# Altium footprint library 3.Inductors&Transformers.PcbLib: 51 footprints (part 2 of 4)
Each footprint in its own frame and in the unit in brackets; x right, y up, seen from the top. Pads: shape width x height; smd on the part's side, far side on the other; paste and mask are expansions set on the pad; w line width, h text height; cw(c..) or ccw(c..) is an arc to the next point about the centre after c.
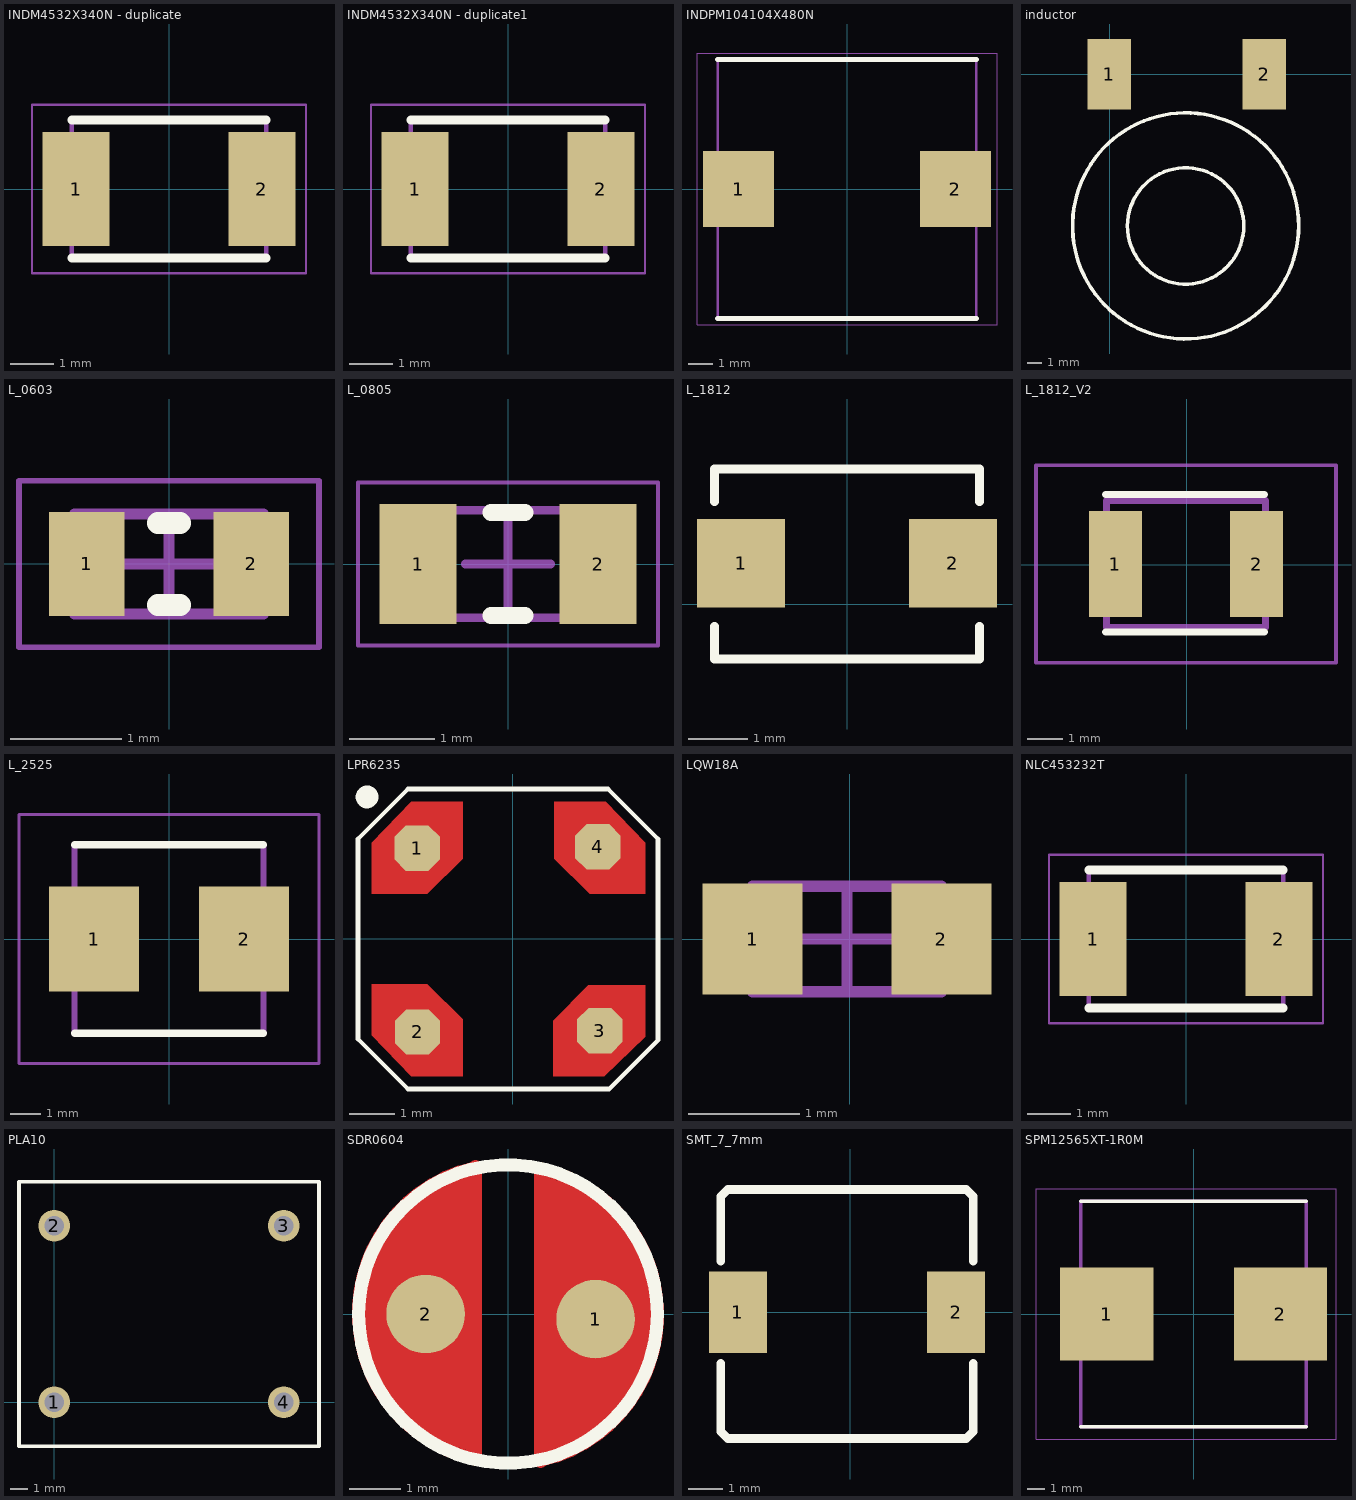
[diagram p1: the footprints below, top view; thin cyan lines are the x and y axes]

## INDM4532X340N - duplicate [mm]
pads (2):
  rect 1.55x2.65 smd: 1(-2.15,0) 2(2.15,0)
Top Overlay:
  lines w0.2: -2.25,-1.6 2.25,-1.6 ; -2.25,1.6 2.25,1.6
Mechanical 13:
  lines w0.1: -2.25,-1.6 2.25,-1.6 2.25,1.6 -2.25,1.6 -2.25,-1.6
Mechanical 15:
  lines w0.05: -3.175,-1.95 3.175,-1.95 3.175,1.95 -3.175,1.95 -3.175,-1.95
3D body "NLC453232T-101K-PF.stp": height 3.4, standoff 0, extent -2.25,-1.6 2.25,1.6

## INDM4532X340N - duplicate1 [mm]
pads (2):
  rect 1.55x2.65 smd: 1(-2.15,0) 2(2.15,0)
Top Overlay:
  lines w0.2: -2.25,-1.6 2.25,-1.6 ; -2.25,1.6 2.25,1.6
Mechanical 13:
  lines w0.1: -2.25,-1.6 -2.25,1.6 2.25,1.6 2.25,-1.6 -2.25,-1.6
Mechanical 15:
  lines w0.05: -3.175,-1.95 -3.175,1.95 3.175,1.95 3.175,-1.95 -3.175,-1.95
3D body "NLC453232T-101K-PF.stp": height 3.4, standoff 0, extent -2.25,-1.6 2.25,1.6

## INDPM104104X480N [mm]
pads (2):
  rect 2.85x3.05 smd: 1(-4.35,0) 2(4.35,0)
Top Overlay:
  lines w0.2: -5.2,-5.2 5.2,-5.2 ; -5.2,5.2 5.2,5.2
Mechanical 13:
  lines w0.1: -5.2,-5.2 5.2,-5.2 5.2,5.2 -5.2,5.2 -5.2,-5.2
Mechanical 15:
  lines w0.05: -6.025,-5.45 6.025,-5.45 6.025,5.45 -6.025,5.45 -6.025,-5.45
3D body "B82464G4153M.stp": height 4.65, standoff -0.05, extent -5,-5 5,5

## inductor [mm]
pads (2):
  rect 3.1x5 smd: 1(-0.025,0) 2(11,0)
Top Overlay:
  circle w0.254: c5.4,-10.8 r4.14
  circle w0.254: c5.4,-10.8 r8.045

## L_0603 [mm] "Chip Inductor, 2-Leads, Body 1,60x0,80mm, IPC Medium Density"
height 0.45
pads (2):
  rect 0.68x0.94 smd: 1(-0.74,0) 2(0.74,0)
Top Overlay:
  lines w0.2: -0.1,-0.37 0.1,-0.37 ; -0.1,0.37 0.1,0.37
Mechanical 13:
  lines w0.1: -0.85,-0.45 0.85,-0.45 0.85,0.45 -0.85,0.45 -0.85,-0.45
Mechanical 15:
  lines w0.05: -1.35,-0.75 1.35,-0.75 1.35,0.75 -1.35,0.75 -1.35,-0.75
  lines w0.1: -0.45,0 0.45,0 ; 0,-0.45 0,0.45
3D body "User Library-Chip Inductor.step": height 0.8, standoff 0, extent -0.851,-0.457 0.749,0.493

## L_0805 [mm] "Chip Capacitor, 2-Leads, Body 2,00x1,25mm, IPC Medium Density"
height 1.3
pads (2):
  rect 0.9x1.4 smd: 1(-1.05,0) 2(1.05,0)
Top Overlay:
  lines w0.2: -0.2,-0.6 0.2,-0.6 ; -0.2,0.6 0.2,0.6
Mechanical 13:
  lines w0.1: -1,-0.625 1,-0.625 1,0.625 -1,0.625 -1,-0.625
Mechanical 15:
  lines w0.05: -1.75,-0.95 1.75,-0.95 1.75,0.95 -1.75,0.95 -1.75,-0.95
  lines w0.1: -0.5,0 0.5,0 ; 0,-0.5 0,0.5
3D body "Coilcraft-0805CS.step": height 1.51, standoff -0.01, extent -1.144,-0.862 1.145,0.863

## L_1812 [mm]
pads (2):
  rect 1.5x1.5 smd: 1(-1.8,0.7) 2(1.8,0.7)
Top Overlay:
  lines w0.15: -2.25,-0.375 -2.25,-0.925 2.25,-0.925 2.25,-0.375 ; -2.25,1.75 -2.25,2.3 2.25,2.3 2.25,1.75
3D body "User Library-L_SMD.step": height 3.2, standoff 0, extent -2.25,-0.875 2.25,2.325

## L_1812_V2 [mm]
pads (2):
  rect 1.5x3 smd: 1(-2.025,0.025) 2(1.975,0.025)
Top Overlay:
  lines w0.2: -2.3,-1.9 2.2,-1.9 ; -2.3,2 2.2,2
Mechanical 13:
  lines w0.2: -2.275,-1.775 2.225,-1.775 2.225,1.825 -2.275,1.825 -2.275,-1.775
Mechanical 15:
  lines w0.1: -4.275,-2.775 4.225,-2.775 4.225,2.825 -4.275,2.825 -4.275,-2.775
3D body "LQH43MN471K03K.stp": height 2.8, standoff 0, extent -2.275,-1.875 2.225,1.925

## L_2525 [mm]
pads (2):
  rect 3x3.5 smd: 1(-2.5,0) 2(2.5,0)
Top Overlay:
  lines w0.25: -3.15,-3.15 3.15,-3.15 ; -3.15,3.15 3.15,3.15
Mechanical 13:
  lines w0.2: -3.15,-3.15 -3.15,3.15 3.15,3.15 3.15,-3.15 -3.15,-3.15
Mechanical 15:
  lines w0.1: -5,-4.15 -5,4.15 5,4.15 5,-4.15 -5,-4.15
3D body "LQH66SN471M03K.stp": height 4.7, standoff 0, extent -3.15,-3.15 3.15,3.15

## LPR6235 [mm]
pads (4):
  oct 1x1 smd: 1(-2.1,2) 2(-2.091,-2.046) 3(1.921,-2.016) 4(1.875,2.025)
Top Layer:
  region: -3.1,2.121 -2.225,3.021 -1.1,3.021 -1.1,1.771 -1.875,0.996 -3.1,0.996
  region: -3.1,-2.121 -2.225,-3.021 -1.1,-3.021 -1.1,-1.771 -1.875,-0.996 -3.1,-0.996
  region: 2.021,-3.021 2.921,-2.146 2.921,-1.021 1.671,-1.021 0.896,-1.796 0.896,-3.021
  region: 2.921,2.121 2.046,3.021 0.921,3.021 0.921,1.771 1.696,0.996 2.921,0.996
Top Overlay:
  circle w0.3: c-3.2,3.125 r0.1
  lines w0.1: -3.4,-2.2 -2.3,-3.3 2.125,-3.3 3.2,-2.225 3.2,2.2 2.1,3.3 -2.3,3.3 -3.4,2.2 -3.4,-2.2
3D body "Coilcraft-LPR6235.step": height 3.35, standoff -0.15, extent -3.173,-3.012 2.907,3.068

## LQW18A [mm]
pads (2):
  rect 0.9x1 smd: 1(-0.875,0) 2(0.825,0)
Mechanical 13:
  lines w0.1: -0.875,-0.475 -0.875,0.475 0.825,0.475 0.825,-0.475 -0.875,-0.475
Mechanical 15:
  lines w0.1: -0.5,0 0.45,0 ; -0.025,-0.475 -0.025,0.475
3D body "User Library-INDC1608X80-MURATA_LQW18A.step": height 0.81, standoff 0, extent -0.8,-0.45 0.8,0.45

## NLC453232T [mm]
pads (2):
  rect 1.55x2.65 smd: 1(-2.15,0) 2(2.15,0)
Top Overlay:
  lines w0.2: -2.25,-1.6 2.25,-1.6 ; -2.25,1.6 2.25,1.6
Mechanical 13:
  lines w0.1: -2.25,-1.6 2.25,-1.6 2.25,1.6 -2.25,1.6 -2.25,-1.6
Mechanical 15:
  lines w0.05: -3.175,-1.95 3.175,-1.95 3.175,1.95 -3.175,1.95 -3.175,-1.95
3D body "NLC453232T-101K-PF.stp": height 3.4, standoff 0, extent -2.25,-1.6 2.25,1.6

## PLA10 [mm]
pads (4):
  round 1.8 hole 1.1: 1(0,0) 2(0,10) 3(13,10) 4(13,0)
Top Overlay:
  lines w0.2: -2,-2.5 15,-2.5 15,12.5 -2,12.5 -2,-2.5
3D body "User Library-PLA10.STEP": height 16.3, standoff -3.3, extent -1.921,-2.475 14.871,12.525

## SDR0604 [mil]
pads (2):
  round 60 smd: 1(66.93,-3.94) 2(-62.99,0)
Top Layer:
  region: -24.9,-106.3 -26.57,-104.63 -26.57,111.6 -34.07,111.6 -47.24,98.43 -59.06,98.43 -82.68,74.8 -86.61,74.8 -86.61,66.93 -110.24,35.43 -114.17,-19.69 -106.3,-43.31 -94.49,-66.93 -59.06,-102.36 -51.18,-102.36 -47.24,-98.43
  region: 24.9,106.3 26.57,104.63 26.57,-111.6 34.07,-111.6 47.24,-98.43 59.06,-98.43 82.68,-74.8 86.61,-74.8 86.61,-66.93 110.24,-35.43 114.17,19.69 106.3,43.31 94.49,66.93 59.06,102.36 51.18,102.36 47.24,98.43
  lines w10: -26.57,111.6 ccw(c-0.13,0.53) -24.9,-110.93 -24.9,112.9 ; 24.9,-112.9 24.9,110.93 cw(c0.13,-0.53) 26.57,-111.6
Top Overlay:
  circle w10: c0,0 r114.17
3D body "SDR0604.step": height -15.75, standoff -194.88, extent -108.43,-106.3 108.43,114.17

## SMT_7_7mm [mm]
pads (2):
  rect 1.7x2.4 smd: 1(-3.3,0) 2(3.1,0)
Top Overlay:
  lines w0.254: -3.8,-1.5 -3.8,-3.5 -3.6,-3.7 3.4,-3.7 3.6,-3.5 3.6,-1.5 ; -3.8,1.5 -3.8,3.4 -3.6,3.6 3.4,3.6 3.6,3.4 3.6,1.5
3D body: height 4.5, standoff 0.1, extent -3.75,-3.7 3.55,3.6

## SPM12565XT-1R0M [mm]
pads (2):
  rect 5.2x5.2 smd: 1(-4.85,0) 2(4.85,0)
Top Overlay:
  lines w0.2: -6.3,-6.3 6.3,-6.3 ; -6.3,6.3 6.3,6.3
Mechanical 13:
  lines w0.2: -6.3,-6.3 6.3,-6.3 6.3,6.3 -6.3,6.3 -6.3,-6.3
Mechanical 15:
  lines w0.05: -8.8,-7 7.95,-7 7.95,7 -8.8,7 -8.8,-7
3D body "SPM12565XT-1R0M.stp": height 6.5, standoff 0, extent -6.5,-6.3 6.5,6.3